# Altium schematic symbol library Analog Devices Data Converters Digital-to-Analog Converters.SchLib: 2231 symbols (part 126 of 135)
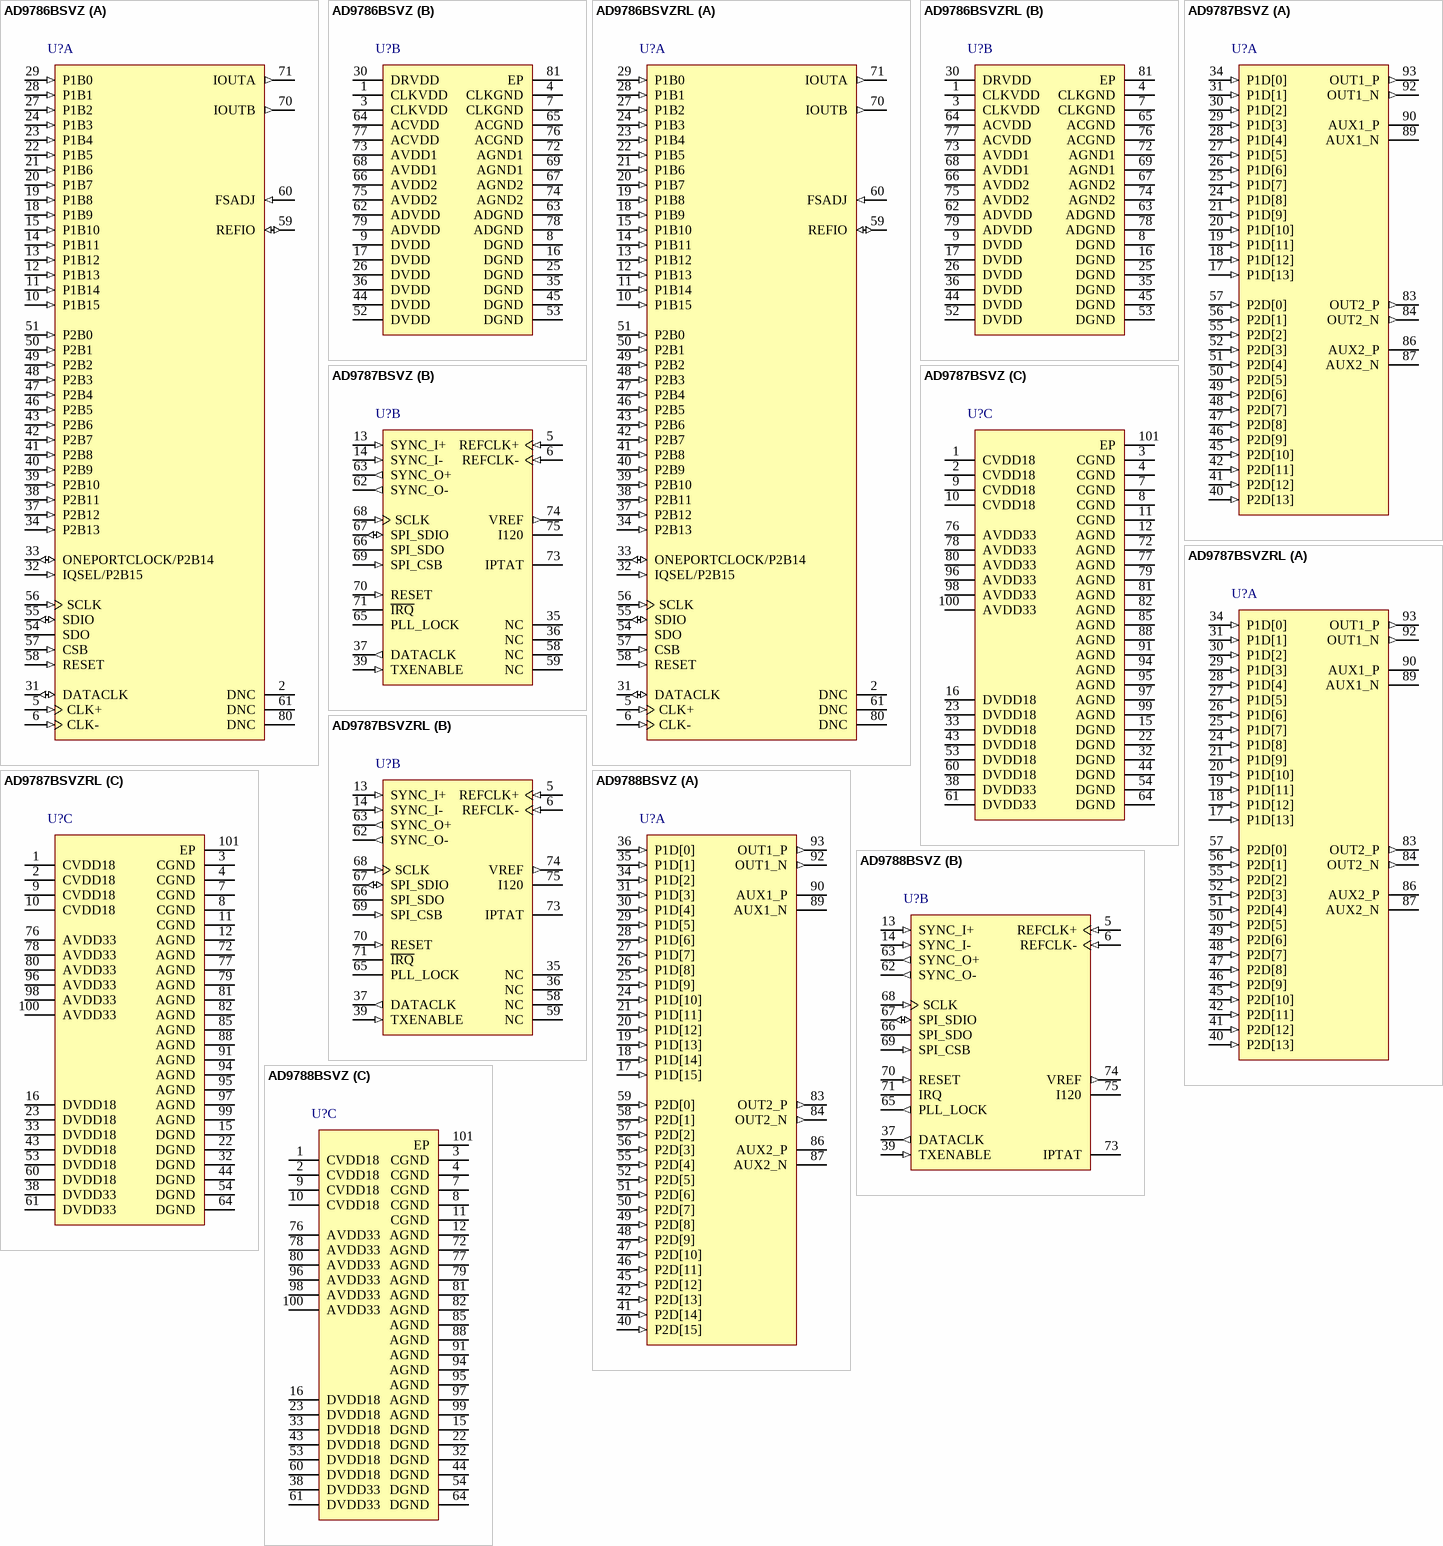
[diagram p238: symbols AD9786BSVZ to AD9788BSVZ]

## AD9787BSVZ
designator U?
14-Bit Digital-to-Analog Converter with Low Power 32-Bit Complex NCO, 800 Msps, 0 to +70 degC, SV-100-1, Pb-Free, Tray; Generic Part Number: AD9787; Manufacturer: Analog Devices; PartNumber: AD9787BSVZ; # DAC Outputs: 2; Max V+: 3.47V; Op Pwr Diss: 450mW; Resolution (Bits): 14; Single Supply: No; DatasheetVersion: Rev.A; PackageVersion: 040506-A; PackageReference: SV-100-1; PackageDescription: 100-Lead Thin Quad Flat Package, Exposed Pad [TQFP_EP]; Supplier 1: Digi-Key; Supplier Part Number 1: AD9787BSVZ-ND; Supplier 2: Mouser; Supplier Part Number 2: 584-AD9787BSVZ; Packing: Tray; RoHS: Y; Mounting Technology: Surface Mount; Code_JEDEC: MS-026-AED-HD; ComponentLink1Description: Manufacturer URL; ComponentLink1URL: http://www.analog.com/en/index.html; ComponentLink2Description: Datasheet; ComponentLink2URL: http://www.analog.com/static/imported-files/data_sheets/AD9785_9787_9788.pdf; ComponentLink3Description: Package Specification; ComponentLink3URL: http://www.analog.com/static/imported-files/packages/PKG_PDF/TQFP_ED(SV)/SV_100_1.pdf; ComponentLink4Description: Product URL; ComponentLink4URL: http://www.analog.com/en/digital-to-analog-converters/da-converters/ad9787/products/product.html
footprint SV-100-1_N (Thin QFP, 100-Leads, Body 14x14mm, Pitch 0.5mm, Thermal Pad 6.5x6.5mm, IPC Medium Density)
footprint SV-100-1_L (Thin QFP, 100-Leads, Body 14x14mm, Pitch 0.5mm, Thermal Pad 6.5x6.5mm, IPC High Density)
footprint SV-100-1_M (Thin QFP, 100-Leads, Body 14x14mm, Pitch 0.5mm, Thermal Pad 6.5x6.5mm, IPC Low Density)
part A pins: 17 P1D[13] (in) "Port 1, Data Input D13 (MSB).", 18 P1D[12] (in) "Port 1, Data Input D12.", 19 P1D[11] (in) "Port 1, Data Input D11.", 20 P1D[10] (in) "Port 1, Data Input D10.", 21 P1D[9] (in) "Port 1, Data Input D9.", 24 P1D[8] (in) "Port 1, Data Input D8.", 25 P1D[7] (in) "Port 1, Data Input D7.", 26 P1D[6] (in) "Port 1, Data Input D6.", 27 P1D[5] (in) "Port 1, Data Input D5.", 28 P1D[4] (in) "Port 1, Data Input D4.", 29 P1D[3] (in) "Port 1, Data Input D3.", 30 P1D[2] (in) "Port 1, Data Input D2.", 31 P1D[1] (in) "Port 1, Data Input D1.", 34 P1D[0] (in) "Port 1, Data Input D0 (LSB).", 40 P2D[13] (in) "Port 2, Data Input D13 (MSB).", 41 P2D[12] (in) "Port 2, Data Input D12.", 42 P2D[11] (in) "Port 2, Data Input D11.", 45 P2D[10] (in) "Port 2, Data Input D10.", 46 P2D[9] (in) "Port 2, Data Input D9.", 47 P2D[8] (in) "Port 2, Data Input D8.", 48 P2D[7] (in) "Port 2, Data Input D7.", 49 P2D[6] (in) "Port 2, Data Input D6.", 50 P2D[5] (in) "Port 2, Data Input D5.", 51 P2D[4] (in) "Port 2, Data Input D4.", 52 P2D[3] (in) "Port 2, Data Input D3.", 55 P2D[2] (in) "Port 2, Data Input D2.", 56 P2D[1] (in) "Port 2, Data Input D1.", 57 P2D[0] (in) "Port 2, Data Input D0 (LSB).", 83 OUT2_P (out) "Differential DAC Current Output, Positive, Channel 2.", 84 OUT2_N (out) "Differential DAC Current Output, Negative, Channel 2.", 86 AUX2_P (hiz) "Auxiliary DAC Current Output, Positive, Channel 2.", 87 AUX2_N (hiz) "Auxiliary DAC Current Output, Negative, Channel 2.", 89 AUX1_N (hiz) "Auxiliary DAC Current Output, Negative, Channel 1.", 90 AUX1_P (hiz) "Auxiliary DAC Current Output, Positive, Channel 1.", 92 OUT1_N (out) "Differential DAC Current Output, Negative, Channel 1.", 93 OUT1_P (out) "Differential DAC Current Output, Positive, Channel 1."
part B pins: 5 REFCLK+ (in) "Differential Clock Input, Positive.", 6 REFCLK- (in) "Differential Clock Input, Negative.", 13 SYNC_I+ (in) "Differential Synchronization Input, Positive.", 14 SYNC_I- (in) "Differential Synchronization Input, Negative.", 35 NC "No Connection Necessary.", 36 NC "No Connection Necessary.", 37 DATACLK (out) "Data Clock Output.", 39 TXENABLE (in) "Transmit Enable.", 58 NC "No Connection Necessary.", 59 NC "No Connection Necessary.", 62 SYNC_O- (out) "Differential Synchronization Output, Negative.", 63 SYNC_O+ (out) "Differential Synchronization Output, Positive.", 65 PLL_LOCK "PLL Lock Indicator.", 66 SPI_SDO (hiz) "SPI Port Data Output", 67 SPI_SDIO (io) "SPI Port Data Input/Output.", 68 SCLK (in) "SPI Port Clock", 69 SPI_CSB (in) "SPI Port Chip Select Bar.", 70 RESET (in) "Reset, Active High.", 71 ~{IRQ} (oc) "Interrupt Request.", 73 IPTAT "Factory Test Pin. Output current is proportional to absolute temperature, approximately 10 uA at 25degreesC with approximately 20 nA/degreesC slope. This pin should remain floating.", 74 VREF (out) "Voltage Reference Output.", 75 I120 "120 uA Reference Current."
part C pins: 1 CVDD18 (power) "1.8 V Clock Supply.", 2 CVDD18 (power) "1.8 V Clock Supply.", 3 CGND (power) "Clock Common.", 4 CGND (power) "Clock Common.", 7 CGND (power) "Clock Common.", 8 CGND (power) "Clock Common.", 9 CVDD18 (power) "1.8 V Clock Supply.", 10 CVDD18 (power) "1.8 V Clock Supply.", 11 CGND (power) "Clock Common.", 12 AGND (power) "Analog Common.", 15 DGND (power) "Digital Common.", 16 DVDD18 (power) "1.8 V Digital Supply.", 22 DGND (power) "Digital Common.", 23 DVDD18 (power) "1.8 V Digital Supply.", 32 DGND (power) "Digital Common.", 33 DVDD18 (power) "1.8 V Digital Supply.", 38 DVDD33 (power) "3.3 V Digital Supply.", 43 DVDD18 (power) "1.8 V Digital Supply.", 44 DGND (power) "Digital Common.", 53 DVDD18 (power) "1.8 V Digital Supply.", 54 DGND (power) "Digital Common.", 60 DVDD18 (power) "1.8 V Digital Supply.", 61 DVDD33 (power) "3.3 V Digital Supply.", 64 DGND (power) "Digital Common.", 72 AGND (power) "Analog Common.", 76 AVDD33 (power) "3.3 V Analog Supply.", 77 AGND (power) "Analog Common.", 78 AVDD33 (power) "3.3 V Analog Supply.", 79 AGND (power) "Analog Common.", 80 AVDD33 (power) "3.3 V Analog Supply.", 81 AGND (power) "Analog Common.", 82 AGND (power) "Analog Common.", 85 AGND (power) "Analog Common.", 88 AGND (power) "Analog Common.", 91 AGND (power) "Analog Common.", 94 AGND (power) "Analog Common.", 95 AGND (power) "Analog Common.", 96 AVDD33 (power) "3.3 V Analog Supply.", 97 AGND (power) "Analog Common.", 98 AVDD33 (power) "3.3 V Analog Supply.", 99 AGND (power) "Analog Common.", 100 AVDD33 (power) "3.3 V Analog Supply.", 101 EP (power) "Conductive Heat Sink. Connect to analog common (AGND)."

## AD9787BSVZRL
designator U?
14-Bit Digital-to-Analog Converter with Low Power 32-Bit Complex NCO, 800 Msps, 0 to +70 degC, SV-100-1, Pb-Free, Reel; Generic Part Number: AD9787; Manufacturer: Analog Devices; PartNumber: AD9787BSVZRL; # DAC Outputs: 2; Max V+: 3.47V; Op Pwr Diss: 450mW; Resolution (Bits): 14; Single Supply: No; DatasheetVersion: Rev.A; PackageVersion: 040506-A; PackageReference: SV-100-1; PackageDescription: 100-Lead Thin Quad Flat Package, Exposed Pad [TQFP_EP]; Supplier 1: Digi-Key; Supplier Part Number 1: AD9787BSVZRL-ND; Supplier 2: Mouser; Supplier Part Number 2: 584-AD9787BSVZR; Packing: Reel; RoHS: Y; Mounting Technology: Surface Mount; Code_JEDEC: MS-026-AED-HD; ComponentLink1Description: Manufacturer URL; ComponentLink1URL: http://www.analog.com/en/index.html; ComponentLink2Description: Datasheet; ComponentLink2URL: http://www.analog.com/static/imported-files/data_sheets/AD9785_9787_9788.pdf; ComponentLink3Description: Package Specification; ComponentLink3URL: http://www.analog.com/static/imported-files/packages/PKG_PDF/TQFP_ED(SV)/SV_100_1.pdf; ComponentLink4Description: Product URL; ComponentLink4URL: http://www.analog.com/en/digital-to-analog-converters/da-converters/ad9787/products/product.html
footprint SV-100-1_N (Thin QFP, 100-Leads, Body 14x14mm, Pitch 0.5mm, Thermal Pad 6.5x6.5mm, IPC Medium Density)
footprint SV-100-1_L (Thin QFP, 100-Leads, Body 14x14mm, Pitch 0.5mm, Thermal Pad 6.5x6.5mm, IPC High Density)
footprint SV-100-1_M (Thin QFP, 100-Leads, Body 14x14mm, Pitch 0.5mm, Thermal Pad 6.5x6.5mm, IPC Low Density)
part A pins: 17 P1D[13] (in) "Port 1, Data Input D13 (MSB).", 18 P1D[12] (in) "Port 1, Data Input D12.", 19 P1D[11] (in) "Port 1, Data Input D11.", 20 P1D[10] (in) "Port 1, Data Input D10.", 21 P1D[9] (in) "Port 1, Data Input D9.", 24 P1D[8] (in) "Port 1, Data Input D8.", 25 P1D[7] (in) "Port 1, Data Input D7.", 26 P1D[6] (in) "Port 1, Data Input D6.", 27 P1D[5] (in) "Port 1, Data Input D5.", 28 P1D[4] (in) "Port 1, Data Input D4.", 29 P1D[3] (in) "Port 1, Data Input D3.", 30 P1D[2] (in) "Port 1, Data Input D2.", 31 P1D[1] (in) "Port 1, Data Input D1.", 34 P1D[0] (in) "Port 1, Data Input D0 (LSB).", 40 P2D[13] (in) "Port 2, Data Input D13 (MSB).", 41 P2D[12] (in) "Port 2, Data Input D12.", 42 P2D[11] (in) "Port 2, Data Input D11.", 45 P2D[10] (in) "Port 2, Data Input D10.", 46 P2D[9] (in) "Port 2, Data Input D9.", 47 P2D[8] (in) "Port 2, Data Input D8.", 48 P2D[7] (in) "Port 2, Data Input D7.", 49 P2D[6] (in) "Port 2, Data Input D6.", 50 P2D[5] (in) "Port 2, Data Input D5.", 51 P2D[4] (in) "Port 2, Data Input D4.", 52 P2D[3] (in) "Port 2, Data Input D3.", 55 P2D[2] (in) "Port 2, Data Input D2.", 56 P2D[1] (in) "Port 2, Data Input D1.", 57 P2D[0] (in) "Port 2, Data Input D0 (LSB).", 83 OUT2_P (out) "Differential DAC Current Output, Positive, Channel 2.", 84 OUT2_N (out) "Differential DAC Current Output, Negative, Channel 2.", 86 AUX2_P (hiz) "Auxiliary DAC Current Output, Positive, Channel 2.", 87 AUX2_N (hiz) "Auxiliary DAC Current Output, Negative, Channel 2.", 89 AUX1_N (hiz) "Auxiliary DAC Current Output, Negative, Channel 1.", 90 AUX1_P (hiz) "Auxiliary DAC Current Output, Positive, Channel 1.", 92 OUT1_N (out) "Differential DAC Current Output, Negative, Channel 1.", 93 OUT1_P (out) "Differential DAC Current Output, Positive, Channel 1."
part B pins: 5 REFCLK+ (in) "Differential Clock Input, Positive.", 6 REFCLK- (in) "Differential Clock Input, Negative.", 13 SYNC_I+ (in) "Differential Synchronization Input, Positive.", 14 SYNC_I- (in) "Differential Synchronization Input, Negative.", 35 NC "No Connection Necessary.", 36 NC "No Connection Necessary.", 37 DATACLK (out) "Data Clock Output.", 39 TXENABLE (in) "Transmit Enable.", 58 NC "No Connection Necessary.", 59 NC "No Connection Necessary.", 62 SYNC_O- (out) "Differential Synchronization Output, Negative.", 63 SYNC_O+ (out) "Differential Synchronization Output, Positive.", 65 PLL_LOCK "PLL Lock Indicator.", 66 SPI_SDO (hiz) "SPI Port Data Output", 67 SPI_SDIO (io) "SPI Port Data Input/Output.", 68 SCLK (in) "SPI Port Clock", 69 SPI_CSB (in) "SPI Port Chip Select Bar.", 70 RESET (in) "Reset, Active High.", 71 ~{IRQ} (oc) "Interrupt Request.", 73 IPTAT "Factory Test Pin. Output current is proportional to absolute temperature, approximately 10 uA at 25degreesC with approximately 20 nA/degreesC slope. This pin should remain floating.", 74 VREF (out) "Voltage Reference Output.", 75 I120 "120 uA Reference Current."
part C pins: 1 CVDD18 (power) "1.8 V Clock Supply.", 2 CVDD18 (power) "1.8 V Clock Supply.", 3 CGND (power) "Clock Common.", 4 CGND (power) "Clock Common.", 7 CGND (power) "Clock Common.", 8 CGND (power) "Clock Common.", 9 CVDD18 (power) "1.8 V Clock Supply.", 10 CVDD18 (power) "1.8 V Clock Supply.", 11 CGND (power) "Clock Common.", 12 AGND (power) "Analog Common.", 15 DGND (power) "Digital Common.", 16 DVDD18 (power) "1.8 V Digital Supply.", 22 DGND (power) "Digital Common.", 23 DVDD18 (power) "1.8 V Digital Supply.", 32 DGND (power) "Digital Common.", 33 DVDD18 (power) "1.8 V Digital Supply.", 38 DVDD33 (power) "3.3 V Digital Supply.", 43 DVDD18 (power) "1.8 V Digital Supply.", 44 DGND (power) "Digital Common.", 53 DVDD18 (power) "1.8 V Digital Supply.", 54 DGND (power) "Digital Common.", 60 DVDD18 (power) "1.8 V Digital Supply.", 61 DVDD33 (power) "3.3 V Digital Supply.", 64 DGND (power) "Digital Common.", 72 AGND (power) "Analog Common.", 76 AVDD33 (power) "3.3 V Analog Supply.", 77 AGND (power) "Analog Common.", 78 AVDD33 (power) "3.3 V Analog Supply.", 79 AGND (power) "Analog Common.", 80 AVDD33 (power) "3.3 V Analog Supply.", 81 AGND (power) "Analog Common.", 82 AGND (power) "Analog Common.", 85 AGND (power) "Analog Common.", 88 AGND (power) "Analog Common.", 91 AGND (power) "Analog Common.", 94 AGND (power) "Analog Common.", 95 AGND (power) "Analog Common.", 96 AVDD33 (power) "3.3 V Analog Supply.", 97 AGND (power) "Analog Common.", 98 AVDD33 (power) "3.3 V Analog Supply.", 99 AGND (power) "Analog Common.", 100 AVDD33 (power) "3.3 V Analog Supply.", 101 EP (power) "Conductive Heat Sink. Connect to analog common (AGND)."

## AD9788BSVZ
designator U?
16-Bit Digital-to-Analog Converter with Low Power 32-Bit Complex NCO, 800 Msps, 0 to +70 degC, SV-100-1, Pb-Free, Tray; Generic Part Number: AD9788; Manufacturer: Analog Devices; PartNumber: AD9788BSVZ; # DAC Outputs: 2; Max V+: 3.47V; Op Pwr Diss: 450mW; Resolution (Bits): 16; Single Supply: No; DatasheetVersion: Rev.A; PackageVersion: 040506-A; PackageReference: SV-100-1; PackageDescription: 100-Lead Thin Quad Flat Package, Exposed Pad [TQFP_EP]; Supplier 1: Digi-Key; Supplier Part Number 1: AD9788BSVZ-ND; Supplier 2: Farnell; Supplier Part Number 2: 1571612; Supplier 3: Newark; Supplier Part Number 3: 84M7832; Supplier 4: Mouser; Supplier Part Number 4: 584-AD9788BSVZ; Packing: Tray; RoHS: Y; Mounting Technology: Surface Mount; Code_JEDEC: MS-026-AED-HD; ComponentLink1Description: Manufacturer URL; ComponentLink1URL: http://www.analog.com/en/index.html; ComponentLink2Description: Datasheet; ComponentLink2URL: http://www.analog.com/static/imported-files/data_sheets/AD9785_9787_9788.pdf; ComponentLink3Description: Package Specification; ComponentLink3URL: http://www.analog.com/static/imported-files/packages/PKG_PDF/TQFP_ED(SV)/SV_100_1.pdf; ComponentLink4Description: Product URL; ComponentLink4URL: http://www.analog.com/en/digital-to-analog-converters/da-converters/ad9788/products/product.html; ComponentLink5Description: Reference Design URL; ComponentLink5URL: http://www.analog.com/en/digital-to-analog-converters/da-converters/ad9788/products/product.html#prod_cross_sell
footprint SV-100-1_N (Thin QFP, 100-Leads, Body 14x14mm, Pitch 0.5mm, Thermal Pad 6.5x6.5mm, IPC Medium Density)
footprint SV-100-1_L (Thin QFP, 100-Leads, Body 14x14mm, Pitch 0.5mm, Thermal Pad 6.5x6.5mm, IPC High Density)
footprint SV-100-1_M (Thin QFP, 100-Leads, Body 14x14mm, Pitch 0.5mm, Thermal Pad 6.5x6.5mm, IPC Low Density)
part A pins: 17 P1D[15] (in) "Port 1, Data Input D15 (MSB).", 18 P1D[14] (in) "Port 1, Data Input D14.", 19 P1D[13] (in) "Port 1, Data Input D13.", 20 P1D[12] (in) "Port 1, Data Input D12.", 21 P1D[11] (in) "Port 1, Data Input D11.", 24 P1D[10] (in) "Port 1, Data Input D10.", 25 P1D[9] (in) "Port 1, Data Input D9.", 26 P1D[8] (in) "Port 1, Data Input D8.", 27 P1D[7] (in) "Port 1, Data Input D7.", 28 P1D[6] (in) "Port 1, Data Input D6.", 29 P1D[5] (in) "Port 1, Data Input D5.", 30 P1D[4] (in) "Port 1, Data Input D4.", 31 P1D[3] (in) "Port 1, Data Input D3.", 34 P1D[2] (in) "Port 1, Data Input D2.", 35 P1D[1] (in) "Port 1, Data Input D1.", 36 P1D[0] (in) "Port 1, Data Input D0 (LSB).", 40 P2D[15] (in) "Port 2, Data Input D15 (MSB).", 41 P2D[14] (in) "Port 2, Data Input D14.", 42 P2D[13] (in) "Port 2, Data Input D13.", 45 P2D[12] (in) "Port 2, Data Input D12.", 46 P2D[11] (in) "Port 2, Data Input D11.", 47 P2D[10] (in) "Port 2, Data Input D10.", 48 P2D[9] (in) "Port 2, Data Input D9.", 49 P2D[8] (in) "Port 2, Data Input D8.", 50 P2D[7] (in) "Port 2, Data Input D7.", 51 P2D[6] (in) "Port 2, Data Input D6.", 52 P2D[5] (in) "Port 2, Data Input D5.", 55 P2D[4] (in) "Port 2, Data Input D4.", 56 P2D[3] (in) "Port 2, Data Input D3.", 57 P2D[2] (in) "Port 2, Data Input D2.", 58 P2D[1] (in) "Port 2, Data Input D1.", 59 P2D[0] (in) "Port 2, Data Input D0 (LSB).", 83 OUT2_P (out) "Differential DAC Current Output, Positive, Channel 2.", 84 OUT2_N (out) "Differential DAC Current Output, Negative, Channel 2.", 86 AUX2_P (hiz) "Auxiliary DAC Current Output, Positive, Channel 2.", 87 AUX2_N (hiz) "Auxiliary DAC Current Output, Negative, Channel 2.", 89 AUX1_N (hiz) "Auxiliary DAC Current Output, Negative, Channel 1.", 90 AUX1_P (hiz) "Auxiliary DAC Current Output, Positive, Channel 1.", 92 OUT1_N (out) "Differential DAC Current Output, Negative, Channel 1.", 93 OUT1_P (out) "Differential DAC Current Output, Positive, Channel 1."
part B pins: 5 REFCLK+ (in) "Differential Clock Input, Positive.", 6 REFCLK- (in) "Differential Clock Input, Negative.", 13 SYNC_I+ (in) "Differential Synchronization Input, Positive.", 14 SYNC_I- (in) "Differential Synchronization Input, Negative.", 37 DATACLK (out) "Data Clock Output.", 39 TXENABLE (in) "Transmit Enable.", 62 SYNC_O- (out) "Differential Synchronization Output, Negative.", 63 SYNC_O+ (out) "Differential Synchronization Output, Positive.", 65 PLL_LOCK (out) "PLL Lock Indicator.", 66 SPI_SDO (hiz) "SPI Port Data Output.", 67 SPI_SDIO (io) "SPI Port Data Input/Output.", 68 SCLK (in) "SPI Port Clock.", 69 SPI_CSB (in) "SPI Port Chip Select Bar.", 70 RESET (in) "Reset, Active High.", 71 IRQ (oc) "Interrupt Request.", 73 IPTAT "Factory Test Pin. Output current is proportional to absolute temperature, approximately 10 uA at 25degreesC with approximately 20 nA/degreesC slope. This pin should remain floating.", 74 VREF (out) "Voltage Reference Output.", 75 I120 "120 uA Reference Current."
part C pins: 1 CVDD18 (power) "1.8 V Clock Supply.", 2 CVDD18 (power) "1.8 V Clock Supply.", 3 CGND (power) "Clock Common.", 4 CGND (power) "Clock Common.", 7 CGND (power) "Clock Common.", 8 CGND (power) "Clock Common.", 9 CVDD18 (power) "1.8 V Clock Supply.", 10 CVDD18 (power) "1.8 V Clock Supply.", 11 CGND (power) "Clock Common.", 12 AGND (power) "Analog Common.", 15 DGND (power) "Digital Common.", 16 DVDD18 (power) "1.8 V Digital Supply.", 22 DGND (power) "Digital Common.", 23 DVDD18 (power) "1.8 V Digital Supply.", 32 DGND (power) "Digital Common.", 33 DVDD18 (power) "1.8 V Digital Supply.", 38 DVDD33 (power) "3.3 V Digital Supply.", 43 DVDD18 (power) "1.8 V Digital Supply.", 44 DGND (power) "Digital Common.", 53 DVDD18 (power) "1.8 V Digital Supply.", 54 DGND (power) "Digital Common.", 60 DVDD18 (power) "1.8 V Digital Supply.", 61 DVDD33 (power) "3.3 V Digital Supply.", 64 DGND (power) "Digital Common.", 72 AGND (power) "Analog Common.", 76 AVDD33 (power) "3.3 V Analog Supply.", 77 AGND (power) "Analog Common.", 78 AVDD33 (power) "3.3 V Analog Supply.", 79 AGND (power) "Analog Common.", 80 AVDD33 (power) "3.3 V Analog Supply.", 81 AGND (power) "Analog Common.", 82 AGND (power) "Analog Common.", 85 AGND (power) "Analog Common.", 88 AGND (power) "Analog Common.", 91 AGND (power) "Analog Common.", 94 AGND (power) "Analog Common.", 95 AGND (power) "Analog Common.", 96 AVDD33 (power) "3.3 V Analog Supply.", 97 AGND (power) "Analog Common.", 98 AVDD33 (power) "3.3 V Analog Supply.", 99 AGND (power) "Analog Common.", 100 AVDD33 (power) "3.3 V Analog Supply.", 101 EP (power) "Conductive Heat Sink. Connect to analog common (AGND)."

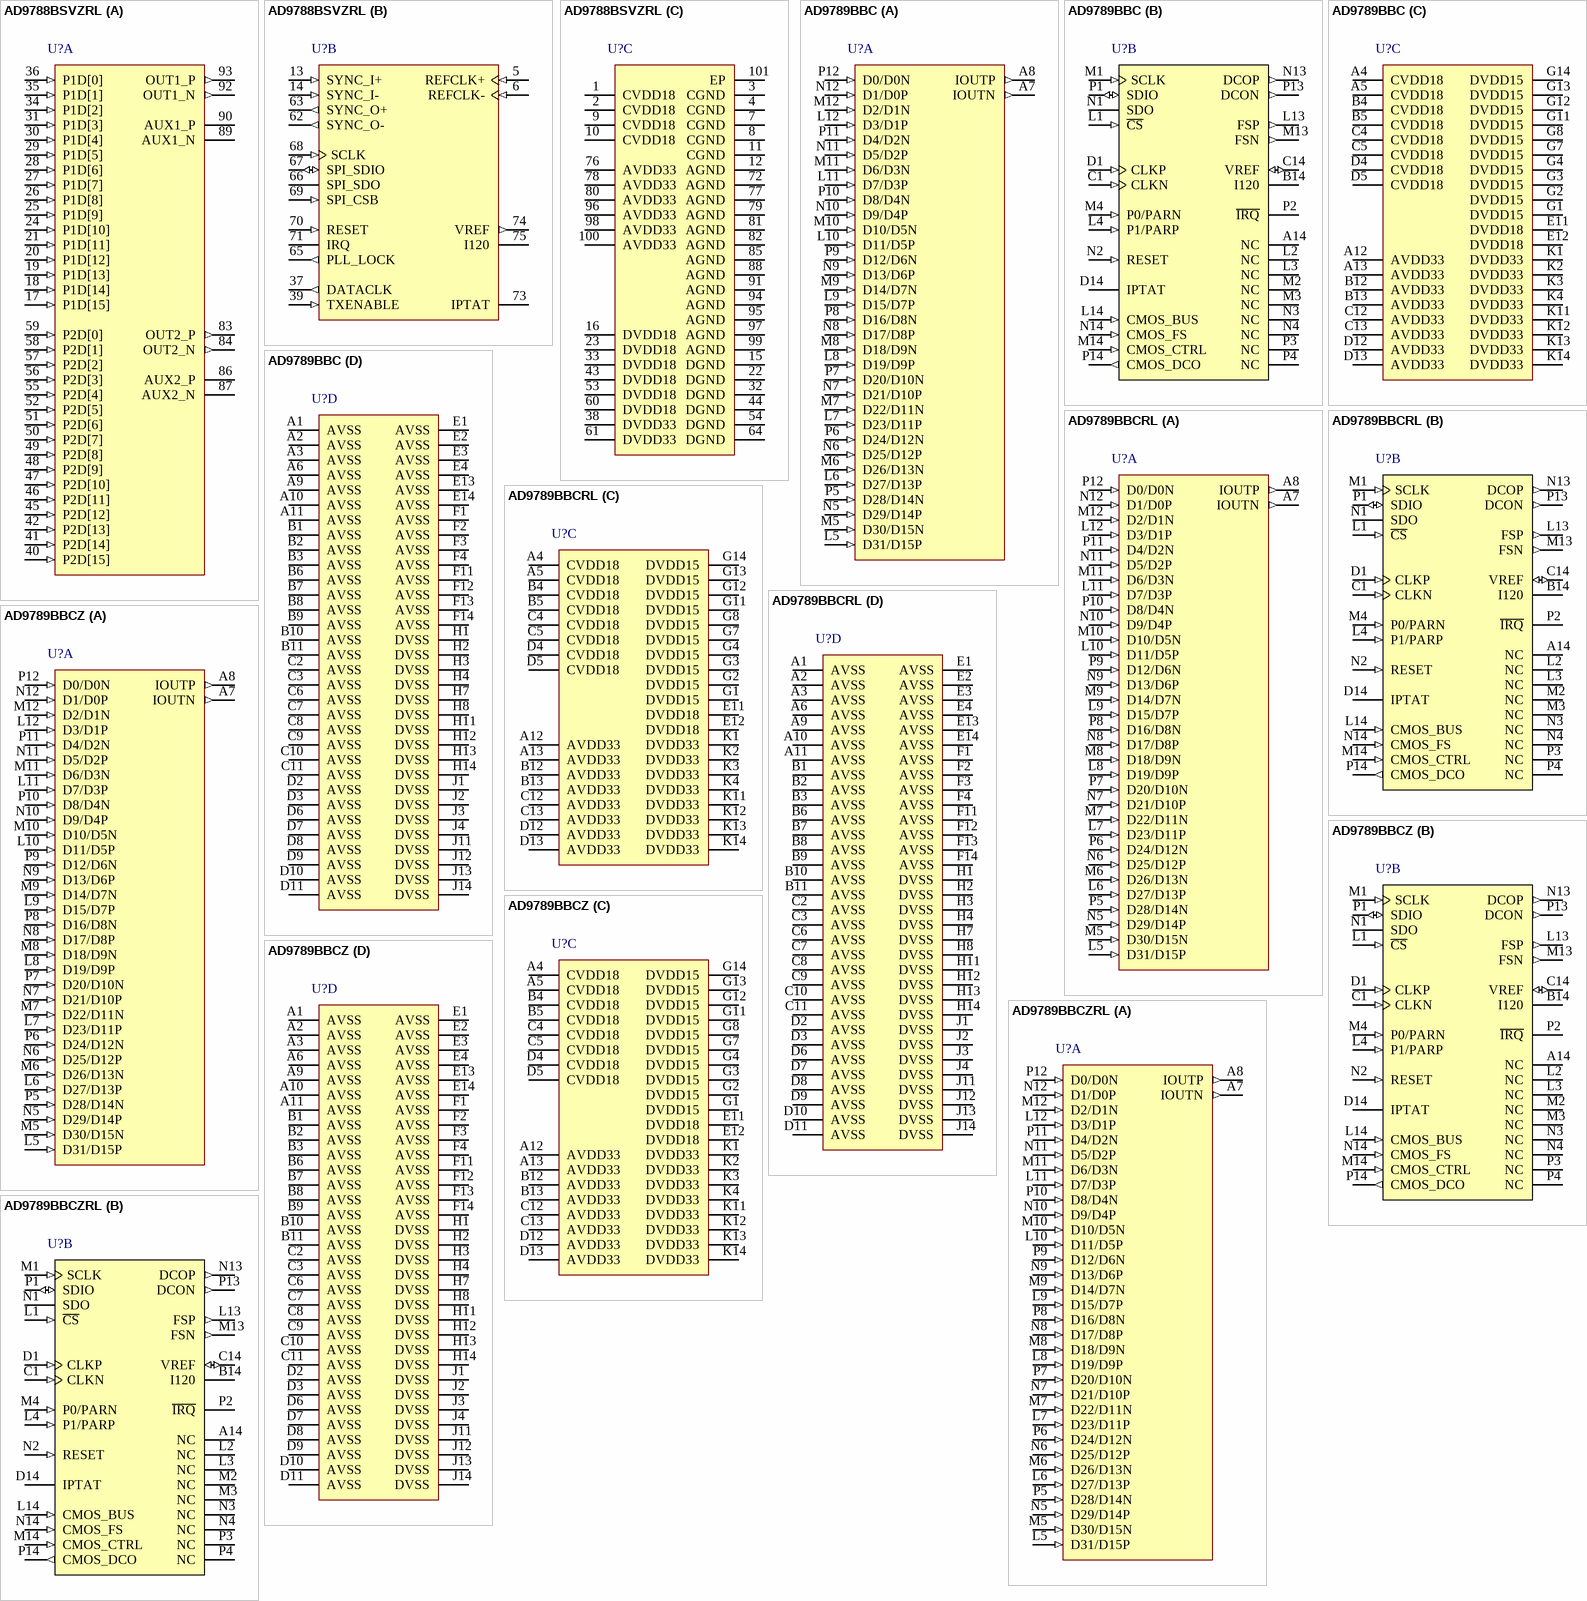
[diagram p106: symbols AD9788BSVZRL to AD9789BBCZRL]

## AD9788BSVZRL
designator U?
16-Bit Digital-to-Analog Converter with Low Power 32-Bit Complex NCO, 800 Msps, 0 to +70 degC, SV-100-1, Pb-Free, Reel; Generic Part Number: AD9788; Manufacturer: Analog Devices; PartNumber: AD9788BSVZRL; # DAC Outputs: 2; Max V+: 3.47V; Op Pwr Diss: 450mW; Resolution (Bits): 16; Single Supply: No; DatasheetVersion: Rev.A; PackageVersion: 040506-A; PackageReference: SV-100-1; PackageDescription: 100-Lead Thin Quad Flat Package, Exposed Pad [TQFP_EP]; Supplier 1: Digi-Key; Supplier Part Number 1: AD9788BSVZRL-ND; Supplier 2: Mouser; Supplier Part Number 2: 584-AD9788BSVZR; Packing: Reel; RoHS: Y; Mounting Technology: Surface Mount; Code_JEDEC: MS-026-AED-HD; ComponentLink1Description: Manufacturer URL; ComponentLink1URL: http://www.analog.com/en/index.html; ComponentLink2Description: Datasheet; ComponentLink2URL: http://www.analog.com/static/imported-files/data_sheets/AD9785_9787_9788.pdf; ComponentLink3Description: Package Specification; ComponentLink3URL: http://www.analog.com/static/imported-files/packages/PKG_PDF/TQFP_ED(SV)/SV_100_1.pdf; ComponentLink4Description: Product URL; ComponentLink4URL: http://www.analog.com/en/digital-to-analog-converters/da-converters/ad9788/products/product.html; ComponentLink5Description: Reference Design URL; ComponentLink5URL: http://www.analog.com/en/digital-to-analog-converters/da-converters/ad9788/products/product.html#prod_cross_sell
footprint SV-100-1_N (Thin QFP, 100-Leads, Body 14x14mm, Pitch 0.5mm, Thermal Pad 6.5x6.5mm, IPC Medium Density)
footprint SV-100-1_L (Thin QFP, 100-Leads, Body 14x14mm, Pitch 0.5mm, Thermal Pad 6.5x6.5mm, IPC High Density)
footprint SV-100-1_M (Thin QFP, 100-Leads, Body 14x14mm, Pitch 0.5mm, Thermal Pad 6.5x6.5mm, IPC Low Density)
part A pins: 17 P1D[15] (in) "Port 1, Data Input D15 (MSB).", 18 P1D[14] (in) "Port 1, Data Input D14.", 19 P1D[13] (in) "Port 1, Data Input D13.", 20 P1D[12] (in) "Port 1, Data Input D12.", 21 P1D[11] (in) "Port 1, Data Input D11.", 24 P1D[10] (in) "Port 1, Data Input D10.", 25 P1D[9] (in) "Port 1, Data Input D9.", 26 P1D[8] (in) "Port 1, Data Input D8.", 27 P1D[7] (in) "Port 1, Data Input D7.", 28 P1D[6] (in) "Port 1, Data Input D6.", 29 P1D[5] (in) "Port 1, Data Input D5.", 30 P1D[4] (in) "Port 1, Data Input D4.", 31 P1D[3] (in) "Port 1, Data Input D3.", 34 P1D[2] (in) "Port 1, Data Input D2.", 35 P1D[1] (in) "Port 1, Data Input D1.", 36 P1D[0] (in) "Port 1, Data Input D0 (LSB).", 40 P2D[15] (in) "Port 2, Data Input D15 (MSB).", 41 P2D[14] (in) "Port 2, Data Input D14.", 42 P2D[13] (in) "Port 2, Data Input D13.", 45 P2D[12] (in) "Port 2, Data Input D12.", 46 P2D[11] (in) "Port 2, Data Input D11.", 47 P2D[10] (in) "Port 2, Data Input D10.", 48 P2D[9] (in) "Port 2, Data Input D9.", 49 P2D[8] (in) "Port 2, Data Input D8.", 50 P2D[7] (in) "Port 2, Data Input D7.", 51 P2D[6] (in) "Port 2, Data Input D6.", 52 P2D[5] (in) "Port 2, Data Input D5.", 55 P2D[4] (in) "Port 2, Data Input D4.", 56 P2D[3] (in) "Port 2, Data Input D3.", 57 P2D[2] (in) "Port 2, Data Input D2.", 58 P2D[1] (in) "Port 2, Data Input D1.", 59 P2D[0] (in) "Port 2, Data Input D0 (LSB).", 83 OUT2_P (out) "Differential DAC Current Output, Positive, Channel 2.", 84 OUT2_N (out) "Differential DAC Current Output, Negative, Channel 2.", 86 AUX2_P (hiz) "Auxiliary DAC Current Output, Positive, Channel 2.", 87 AUX2_N (hiz) "Auxiliary DAC Current Output, Negative, Channel 2.", 89 AUX1_N (hiz) "Auxiliary DAC Current Output, Negative, Channel 1.", 90 AUX1_P (hiz) "Auxiliary DAC Current Output, Positive, Channel 1.", 92 OUT1_N (out) "Differential DAC Current Output, Negative, Channel 1.", 93 OUT1_P (out) "Differential DAC Current Output, Positive, Channel 1."
part B pins: 5 REFCLK+ (in) "Differential Clock Input, Positive.", 6 REFCLK- (in) "Differential Clock Input, Negative.", 13 SYNC_I+ (in) "Differential Synchronization Input, Positive.", 14 SYNC_I- (in) "Differential Synchronization Input, Negative.", 37 DATACLK (out) "Data Clock Output.", 39 TXENABLE (in) "Transmit Enable.", 62 SYNC_O- (out) "Differential Synchronization Output, Negative.", 63 SYNC_O+ (out) "Differential Synchronization Output, Positive.", 65 PLL_LOCK (out) "PLL Lock Indicator.", 66 SPI_SDO (hiz) "SPI Port Data Output.", 67 SPI_SDIO (io) "SPI Port Data Input/Output.", 68 SCLK (in) "SPI Port Clock.", 69 SPI_CSB (in) "SPI Port Chip Select Bar.", 70 RESET (in) "Reset, Active High.", 71 IRQ (oc) "Interrupt Request.", 73 IPTAT "Factory Test Pin. Output current is proportional to absolute temperature, approximately 10 uA at 25degreesC with approximately 20 nA/degreesC slope. This pin should remain floating.", 74 VREF (out) "Voltage Reference Output.", 75 I120 "120 uA Reference Current."
part C pins: 1 CVDD18 (power) "1.8 V Clock Supply.", 2 CVDD18 (power) "1.8 V Clock Supply.", 3 CGND (power) "Clock Common.", 4 CGND (power) "Clock Common.", 7 CGND (power) "Clock Common.", 8 CGND (power) "Clock Common.", 9 CVDD18 (power) "1.8 V Clock Supply.", 10 CVDD18 (power) "1.8 V Clock Supply.", 11 CGND (power) "Clock Common.", 12 AGND (power) "Analog Common.", 15 DGND (power) "Digital Common.", 16 DVDD18 (power) "1.8 V Digital Supply.", 22 DGND (power) "Digital Common.", 23 DVDD18 (power) "1.8 V Digital Supply.", 32 DGND (power) "Digital Common.", 33 DVDD18 (power) "1.8 V Digital Supply.", 38 DVDD33 (power) "3.3 V Digital Supply.", 43 DVDD18 (power) "1.8 V Digital Supply.", 44 DGND (power) "Digital Common.", 53 DVDD18 (power) "1.8 V Digital Supply.", 54 DGND (power) "Digital Common.", 60 DVDD18 (power) "1.8 V Digital Supply.", 61 DVDD33 (power) "3.3 V Digital Supply.", 64 DGND (power) "Digital Common.", 72 AGND (power) "Analog Common.", 76 AVDD33 (power) "3.3 V Analog Supply.", 77 AGND (power) "Analog Common.", 78 AVDD33 (power) "3.3 V Analog Supply.", 79 AGND (power) "Analog Common.", 80 AVDD33 (power) "3.3 V Analog Supply.", 81 AGND (power) "Analog Common.", 82 AGND (power) "Analog Common.", 85 AGND (power) "Analog Common.", 88 AGND (power) "Analog Common.", 91 AGND (power) "Analog Common.", 94 AGND (power) "Analog Common.", 95 AGND (power) "Analog Common.", 96 AVDD33 (power) "3.3 V Analog Supply.", 97 AGND (power) "Analog Common.", 98 AVDD33 (power) "3.3 V Analog Supply.", 99 AGND (power) "Analog Common.", 100 AVDD33 (power) "3.3 V Analog Supply.", 101 EP (power) "Conductive Heat Sink. Connect to analog common (AGND)."